# Altium schematic symbol library CMOS&TTL74.SCHLIB: 720 symbols (part 7 of 7)
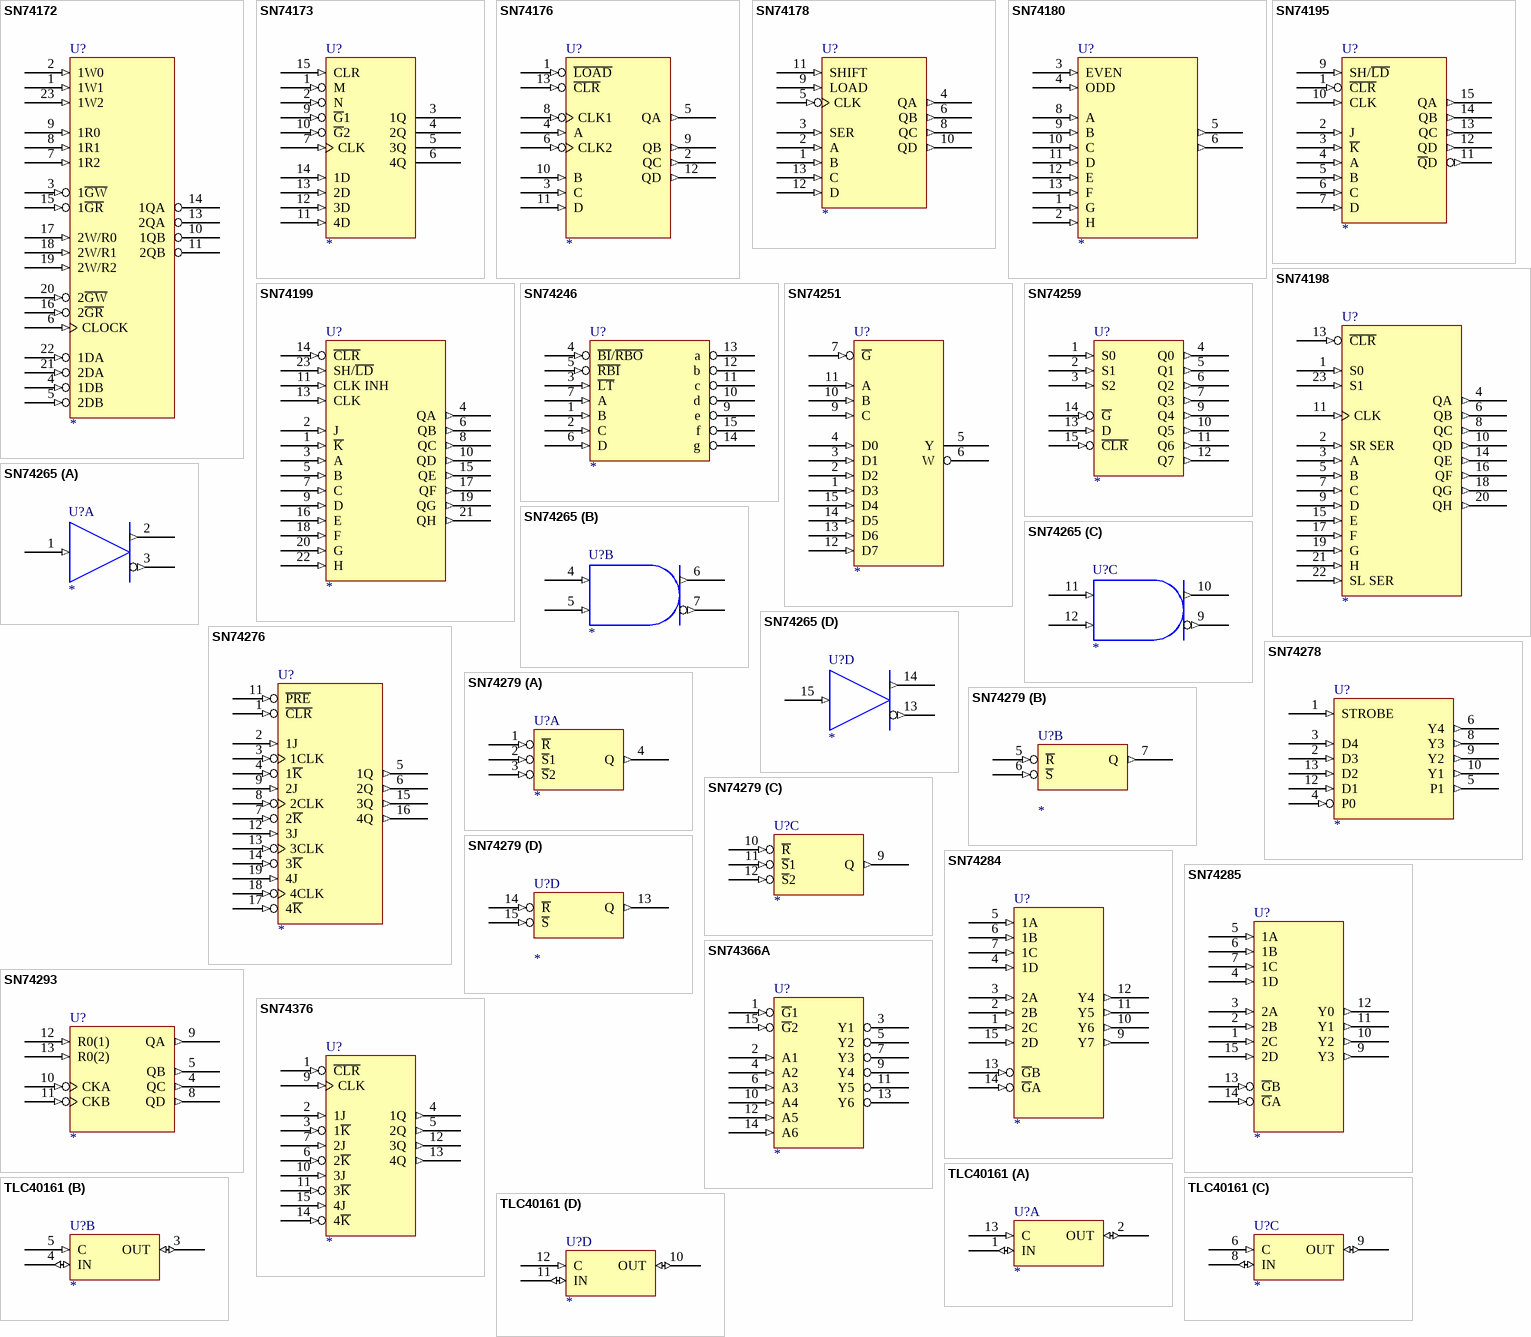
[diagram p39: symbols SN74172 to TLC40161]

## SN74276
designator U?
QUAD JK FF
footprint DIP-20
pins: 1 ~{CLR} (in), 2 1J (in), 3 1CLK (in), 4 1~{K} (in), 5 1Q (out), 6 2Q (out), 7 2~{K} (in), 8 2CLK (in), 9 2J (in), 10 GND (power) hidden to GND, 11 ~{PRE} (in), 12 3J (in), 13 3CLK (in), 14 3~{K} (in), 15 3Q (out), 16 4Q (out), 17 4~{K} (in), 18 4CLK (in), 19 4J (in), 20 VCC (power) hidden to VCC
1 alternate drawing of the same symbol

## SN74278
designator U?
f4-BIT CASCADED PRIORITY REG
footprint DIP-14
pins: 1 STROBE (in), 2 D3 (in), 3 D4 (in), 4 P0 (in), 5 P1 (out), 6 Y4 (out), 7 GND (power) hidden to GND, 8 Y3 (out), 9 Y2 (out), 10 Y1 (out), 12 D1 (in), 13 D2 (in), 14 VCC (power) hidden to VCC
1 alternate drawing of the same symbol

## SN74279
designator U?
QUAD S\-R\ LCH
footprint DIP-16
footprint SO16
part A pins: 1 ~{R} (in), 2 ~{S}1 (in), 3 ~{S}2 (in), 4 Q (out), 8 GND (power) hidden to GND, 16 VCC (power) hidden to VCC
part B pins: 5 ~{R} (in), 6 ~{S} (in), 7 Q (out), 8 GND (power) hidden to GND, 16 VCC (power) hidden to VCC
part C pins: 8 GND (power) hidden to GND, 9 Q (out), 10 ~{R} (in), 11 ~{S}1 (in), 12 ~{S}2 (in), 16 VCC (power) hidden to VCC
part D pins: 8 GND (power) hidden to GND, 13 Q (out), 14 ~{R} (in), 15 ~{S} (in), 16 VCC (power) hidden to VCC
1 alternate drawing of the same symbol

## SN74284
designator U?
4-BIT BY 4-BIT PARALLEL BIN MULT
footprint DIP-16
pins: 1 2C (in), 2 2B (in), 3 2A (in), 4 1D (in), 5 1A (in), 6 1B (in), 7 1C (in), 8 GND (power) hidden to GND, 9 Y7 (out), 10 Y6 (out), 11 Y5 (out), 12 Y4 (out), 13 ~{G}B (in), 14 ~{G}A (in), 15 2D (in), 16 VCC (power) hidden to VCC
1 alternate drawing of the same symbol

## SN74285
designator U?
4-BIT BY 4-BIT PARALLEL BIN MULT
footprint DIP-16
pins: 1 2C (in), 2 2B (in), 3 2A (in), 4 1D (in), 5 1A (in), 6 1B (in), 7 1C (in), 8 GND (power) hidden to GND, 9 Y3 (out), 10 Y2 (out), 11 Y1 (out), 12 Y0 (out), 13 ~{G}B (in), 14 ~{G}A (in), 15 2D (in), 16 VCC (power) hidden to VCC
1 alternate drawing of the same symbol

## SN74293
designator U?
DECADE AND 4-BIT BIN CNT
footprint DIP-14
footprint SO14
pins: 4 QC (out), 5 QB (out), 7 GND (power) hidden to GND, 8 QD (out), 9 QA (out), 10 CKA (in), 11 CKB (in), 12 R0(1) (in), 13 R0(2) (in), 14 VCC (power) hidden to VCC
1 alternate drawing of the same symbol

## SN74366A
designator U?
HEX BUS DRV 3SO
footprint DIP-16
footprint SO16
pins: 1 ~{G}1 (in), 2 A1 (in), 3 Y1 (hiz), 4 A2 (in), 5 Y2 (hiz), 6 A3 (in), 7 Y3 (hiz), 8 GND (power) hidden to GND, 9 Y4 (hiz), 10 A4 (in), 11 Y5 (hiz), 12 A5 (in), 13 Y6 (hiz), 14 A6 (in), 15 ~{G}2 (in), 16 VCC (power) hidden to VCC
1 alternate drawing of the same symbol

## SN74376
designator U?
QUAD J-K\ FF
footprint DIP-16
pins: 1 ~{CLR} (in), 2 1J (in), 3 1~{K} (in), 4 1Q (out), 5 2Q (out), 6 2~{K} (in), 7 2J (in), 8 GND (power) hidden to GND, 9 CLK (in), 10 3J (in), 11 3~{K} (in), 12 3Q (out), 13 4Q (out), 14 4~{K} (in), 15 4J (in), 16 VCC (power) hidden to VCC
1 alternate drawing of the same symbol

## TLC40161
designator U?
QUAD ANALOG SWITCH MULTIPLEXER
footprint SO14
footprint DIP-14
part A pins: 1 IN (io), 2 OUT (io), 7 GND (power) hidden to GND, 13 C (in), 14 VCC (power) hidden to VCC
part B pins: 3 OUT (io), 4 IN (io), 5 C (in), 7 GND (power) hidden to GND, 14 VCC (power) hidden to VCC
part C pins: 6 C (in), 7 GND (power) hidden to GND, 8 IN (io), 9 OUT (io), 14 VCC (power) hidden to VCC
part D pins: 7 GND (power) hidden to GND, 10 OUT (io), 11 IN (io), 12 C (in), 14 VCC (power) hidden to VCC
1 alternate drawing of the same symbol